# Altium schematic symbol library jlcpcb_2025_04_capacitors_extended_0805.schlib: 3281 symbols (part 15 of 18) (continued)
## GRM21BZ71H475KE15L
designator C?  Capacitance: 4.7uF  (hidden comment: *)
Capacitor, Ceramic (MLCC), 4.7uF, ±10%, 50V, X7R, ±10%, SMD 0805; Manufacturer: Murata Electronics; Manufacturer Part Number: GRM21BZ71H475KE15L; Package Size: 0805; JLCPCB Basic Part: No; JLCPCB Part Number: C437557; Supplier 1: LCSC; Category: Capacitors - MLCC; Supplier Part Number 1: C437557; Tolerance: ±10%; Voltage Rating: 50V; Temperature Coefficient: X7R; RoHS: Yes; ComponentLink1Description: Datasheet; ComponentLink1URL: https://wmsc.lcsc.com/wmsc/upload/file/pdf/v2/lcsc/2304140030_Murata-Electronics-GRM21BZ71H475KE15L_C437557.pdf; ComponentLink2Description: JLCPCB Part URL; ComponentLink2URL: https://jlcpcb.com/partdetail/C437557; ComponentLink3Description: LCSC Part URL; ComponentLink3URL: https://lcsc.com/product-detail/Multilayer-Ceramic-Capacitors-MLCC---SMD-SMT_Murata-Electronics-Murata-Electronics-GRM21BZ71H475KE15L_C437557.html
footprint CAP-0805 (0805 (2012M) Capacitor)
pins: 1, 2

## GRM216B11H223KA01D
designator C?  Capacitance: 22nF  (hidden comment: *)
Capacitor, Ceramic (MLCC), 22nF, ±10%, 50V, B, ±10%, SMD 0805; Manufacturer: Murata Electronics; Manufacturer Part Number: GRM216B11H223KA01D; Package Size: 0805; JLCPCB Basic Part: No; JLCPCB Part Number: C521244; Supplier 1: LCSC; Category: Capacitors - MLCC; Supplier Part Number 1: C521244; Tolerance: ±10%; Voltage Rating: 50V; Temperature Coefficient: B; RoHS: Yes; ComponentLink1Description: Datasheet; ComponentLink1URL: https://wmsc.lcsc.com/wmsc/upload/file/pdf/v2/lcsc/2005071505_Murata-Electronics-GRM216B11H223KA01D_C521244.pdf; ComponentLink2Description: JLCPCB Part URL; ComponentLink2URL: https://jlcpcb.com/partdetail/C521244; ComponentLink3Description: LCSC Part URL; ComponentLink3URL: https://lcsc.com/product-detail/Multilayer-Ceramic-Capacitors-MLCC---SMD-SMT_Murata-Electronics-Murata-Electronics-GRM216B11H223KA01D_C521244.html
footprint CAP-0805 (0805 (2012M) Capacitor)
pins: 1, 2

## GRM216R61E105KA12D
designator C?  Capacitance: 1uF  (hidden comment: *)
Capacitor, Ceramic (MLCC), 1uF, ±10%, 25V, X5R, ±10%, SMD 0805; Manufacturer: Murata Electronics; Manufacturer Part Number: GRM216R61E105KA12D; Package Size: 0805; JLCPCB Basic Part: No; JLCPCB Part Number: C440193; Supplier 1: LCSC; Category: Capacitors - MLCC; Supplier Part Number 1: C440193; Tolerance: ±10%; Voltage Rating: 25V; Temperature Coefficient: X5R; RoHS: Yes; ComponentLink1Description: Datasheet; ComponentLink1URL: https://wmsc.lcsc.com/wmsc/upload/file/pdf/v2/lcsc/2304140030_Murata-Electronics-GRM216R61E105KA12D_C440193.pdf; ComponentLink2Description: JLCPCB Part URL; ComponentLink2URL: https://jlcpcb.com/partdetail/C440193; ComponentLink3Description: LCSC Part URL; ComponentLink3URL: https://lcsc.com/product-detail/Multilayer-Ceramic-Capacitors-MLCC---SMD-SMT_Murata-Electronics-Murata-Electronics-GRM216R61E105KA12D_C440193.html
footprint CAP-0805 (0805 (2012M) Capacitor)
pins: 1, 2

## GRM216R71H103KA01D
designator C?  Capacitance: 10nF  (hidden comment: *)
Capacitor, Ceramic (MLCC), 10nF, ±10%, 50V, X7R, ±10%, SMD 0805; Manufacturer: Murata Electronics; Manufacturer Part Number: GRM216R71H103KA01D; Package Size: 0805; JLCPCB Basic Part: No; JLCPCB Part Number: C77065; Supplier 1: LCSC; Category: Capacitors - MLCC; Supplier Part Number 1: C77065; Tolerance: ±10%; Voltage Rating: 50V; Temperature Coefficient: X7R; RoHS: Yes; ComponentLink1Description: Datasheet; ComponentLink1URL: https://wmsc.lcsc.com/wmsc/upload/file/pdf/v2/lcsc/2304140030_Murata-Electronics-GRM216R71H103KA01D_C77065.pdf; ComponentLink2Description: JLCPCB Part URL; ComponentLink2URL: https://jlcpcb.com/partdetail/C77065; ComponentLink3Description: LCSC Part URL; ComponentLink3URL: https://lcsc.com/product-detail/Multilayer-Ceramic-Capacitors-MLCC---SMD-SMT_Murata-Electronics-Murata-Electronics-GRM216R71H103KA01D_C77065.html
footprint CAP-0805 (0805 (2012M) Capacitor)
pins: 1, 2

## GRM216R71H152KA01D
designator C?  Capacitance: 1.5nF  (hidden comment: *)
Capacitor, Ceramic (MLCC), 1.5nF, ±10%, 50V, X7R, ±10%, SMD 0805; Manufacturer: Murata Electronics; Manufacturer Part Number: GRM216R71H152KA01D; Package Size: 0805; JLCPCB Basic Part: No; JLCPCB Part Number: C408139; Supplier 1: LCSC; Category: Capacitors - MLCC; Supplier Part Number 1: C408139; Tolerance: ±10%; Voltage Rating: 50V; Temperature Coefficient: X7R; RoHS: Yes; ComponentLink1Description: Datasheet; ComponentLink1URL: https://wmsc.lcsc.com/wmsc/upload/file/pdf/v2/lcsc/2304140030_Murata-Electronics-GRM216R71H152KA01D_C408139.pdf; ComponentLink2Description: JLCPCB Part URL; ComponentLink2URL: https://jlcpcb.com/partdetail/C408139; ComponentLink3Description: LCSC Part URL; ComponentLink3URL: https://lcsc.com/product-detail/Multilayer-Ceramic-Capacitors-MLCC---SMD-SMT_Murata-Electronics-Murata-Electronics-GRM216R71H152KA01D_C408139.html
footprint CAP-0805 (0805 (2012M) Capacitor)
pins: 1, 2

## GRM216R71H153KA01D
designator C?  Capacitance: 15nF  (hidden comment: *)
Capacitor, Ceramic (MLCC), 15nF, ±10%, 50V, X7R, ±10%, SMD 0805; Manufacturer: Murata Electronics; Manufacturer Part Number: GRM216R71H153KA01D; Package Size: 0805; JLCPCB Basic Part: No; JLCPCB Part Number: C435404; Supplier 1: LCSC; Category: Capacitors - MLCC; Supplier Part Number 1: C435404; Tolerance: ±10%; Voltage Rating: 50V; Temperature Coefficient: X7R; RoHS: Yes; ComponentLink1Description: Datasheet; ComponentLink1URL: https://wmsc.lcsc.com/wmsc/upload/file/pdf/v2/lcsc/2304140030_Murata-Electronics-GRM216R71H153KA01D_C435404.pdf; ComponentLink2Description: JLCPCB Part URL; ComponentLink2URL: https://jlcpcb.com/partdetail/C435404; ComponentLink3Description: LCSC Part URL; ComponentLink3URL: https://lcsc.com/product-detail/Multilayer-Ceramic-Capacitors-MLCC---SMD-SMT_Murata-Electronics-Murata-Electronics-GRM216R71H153KA01D_C435404.html
footprint CAP-0805 (0805 (2012M) Capacitor)
pins: 1, 2

## GRM216R71H222KA01D
designator C?  Capacitance: 2.2nF  (hidden comment: *)
Capacitor, Ceramic (MLCC), 2.2nF, ±10%, 50V, X7R, ±10%, SMD 0805; Manufacturer: Murata Electronics; Manufacturer Part Number: GRM216R71H222KA01D; Package Size: 0805; JLCPCB Basic Part: No; JLCPCB Part Number: C425880; Supplier 1: LCSC; Category: Capacitors - MLCC; Supplier Part Number 1: C425880; Tolerance: ±10%; Voltage Rating: 50V; Temperature Coefficient: X7R; RoHS: Yes; ComponentLink1Description: Datasheet; ComponentLink1URL: https://wmsc.lcsc.com/wmsc/upload/file/pdf/v2/lcsc/2304140030_Murata-Electronics-GRM216R71H222KA01D_C425880.pdf; ComponentLink2Description: JLCPCB Part URL; ComponentLink2URL: https://jlcpcb.com/partdetail/C425880; ComponentLink3Description: LCSC Part URL; ComponentLink3URL: https://lcsc.com/product-detail/Multilayer-Ceramic-Capacitors-MLCC---SMD-SMT_Murata-Electronics-Murata-Electronics-GRM216R71H222KA01D_C425880.html
footprint CAP-0805 (0805 (2012M) Capacitor)
pins: 1, 2

## GRM219B11E224KA01D
designator C?  Capacitance: 220nF  (hidden comment: *)
Capacitor, Ceramic (MLCC), 220nF, ±10%, 25V, B, ±10%, SMD 0805; Manufacturer: Murata Electronics; Manufacturer Part Number: GRM219B11E224KA01D; Package Size: 0805; JLCPCB Basic Part: No; JLCPCB Part Number: C415405; Supplier 1: LCSC; Category: Capacitors - MLCC; Supplier Part Number 1: C415405; Tolerance: ±10%; Voltage Rating: 25V; Temperature Coefficient: B; RoHS: Yes; ComponentLink1Description: Datasheet; ComponentLink1URL: https://wmsc.lcsc.com/wmsc/upload/file/pdf/v2/lcsc/2304140030_Murata-Electronics-GRM219B11E224KA01D_C415405.pdf; ComponentLink2Description: JLCPCB Part URL; ComponentLink2URL: https://jlcpcb.com/partdetail/C415405; ComponentLink3Description: LCSC Part URL; ComponentLink3URL: https://lcsc.com/product-detail/Multilayer-Ceramic-Capacitors-MLCC---SMD-SMT_Murata-Electronics-Murata-Electronics-GRM219B11E224KA01D_C415405.html
footprint CAP-0805 (0805 (2012M) Capacitor)
pins: 1, 2

## GRM219B31A475KE33D
designator C?  Capacitance: 4.7uF  (hidden comment: *)
Capacitor, Ceramic (MLCC), 4.7uF, ±10%, ±10%, SMD 0805; Manufacturer: Murata Electronics; Manufacturer Part Number: GRM219B31A475KE33D; Package Size: 0805; JLCPCB Basic Part: No; JLCPCB Part Number: C913642; Supplier 1: LCSC; Category: Capacitors - MLCC; Supplier Part Number 1: C913642; Tolerance: ±10%; RoHS: Yes; ComponentLink1Description: Datasheet; ComponentLink1URL: https://wmsc.lcsc.com/wmsc/upload/file/pdf/v2/lcsc/2201131300_Murata-Electronics-GRM219B31A475KE33D_C913642.pdf; ComponentLink2Description: JLCPCB Part URL; ComponentLink2URL: https://jlcpcb.com/partdetail/C913642; ComponentLink3Description: LCSC Part URL; ComponentLink3URL: https://lcsc.com/product-detail/Multilayer-Ceramic-Capacitors-MLCC---SMD-SMT_Murata-Electronics-Murata-Electronics-GRM219B31A475KE33D_C913642.html
footprint CAP-0805 (0805 (2012M) Capacitor)
pins: 1, 2

## GRM219B31H225KE15D
designator C?  Capacitance: 2.2uF  (hidden comment: *)
Capacitor, Ceramic (MLCC), 2.2uF, ±10%, 50V, B, ±10%, SMD 0805; Manufacturer: Murata Electronics; Manufacturer Part Number: GRM219B31H225KE15D; Package Size: 0805; JLCPCB Basic Part: No; JLCPCB Part Number: C415371; Supplier 1: LCSC; Category: Capacitors - MLCC; Supplier Part Number 1: C415371; Tolerance: ±10%; Voltage Rating: 50V; Temperature Coefficient: B; RoHS: Yes; ComponentLink1Description: Datasheet; ComponentLink1URL: https://wmsc.lcsc.com/wmsc/upload/file/pdf/v2/lcsc/2304140030_Murata-Electronics-GRM219B31H225KE15D_C415371.pdf; ComponentLink2Description: JLCPCB Part URL; ComponentLink2URL: https://jlcpcb.com/partdetail/C415371; ComponentLink3Description: LCSC Part URL; ComponentLink3URL: https://lcsc.com/product-detail/Multilayer-Ceramic-Capacitors-MLCC---SMD-SMT_Murata-Electronics-Murata-Electronics-GRM219B31H225KE15D_C415371.html
footprint CAP-0805 (0805 (2012M) Capacitor)
pins: 1, 2

## GRM219B31H334KA87D
designator C?  Capacitance: 330nF  (hidden comment: *)
Capacitor, Ceramic (MLCC), 330nF, ±10%, 50V, B, ±10%, SMD 0805; Manufacturer: Murata Electronics; Manufacturer Part Number: GRM219B31H334KA87D; Package Size: 0805; JLCPCB Basic Part: No; JLCPCB Part Number: C464408; Supplier 1: LCSC; Category: Capacitors - MLCC; Supplier Part Number 1: C464408; Tolerance: ±10%; Voltage Rating: 50V; Temperature Coefficient: B; RoHS: Yes; ComponentLink1Description: Datasheet; ComponentLink1URL: https://wmsc.lcsc.com/wmsc/upload/file/pdf/v2/lcsc/2304140030_Murata-Electronics-GRM219B31H334KA87D_C464408.pdf; ComponentLink2Description: JLCPCB Part URL; ComponentLink2URL: https://jlcpcb.com/partdetail/C464408; ComponentLink3Description: LCSC Part URL; ComponentLink3URL: https://lcsc.com/product-detail/Multilayer-Ceramic-Capacitors-MLCC---SMD-SMT_Murata-Electronics-Murata-Electronics-GRM219B31H334KA87D_C464408.html
footprint CAP-0805 (0805 (2012M) Capacitor)
pins: 1, 2

## GRM219C71E475KE21L
designator C?  Capacitance: 4.7uF  (hidden comment: *)
Capacitor, Ceramic (MLCC), 4.7uF, ±10%, 25V, X7S, ±10%, SMD 0805; Manufacturer: Murata Electronics; Manufacturer Part Number: GRM219C71E475KE21L; Package Size: 0805; JLCPCB Basic Part: No; JLCPCB Part Number: C710952; Supplier 1: LCSC; Category: Capacitors - MLCC; Supplier Part Number 1: C710952; Tolerance: ±10%; Voltage Rating: 25V; Temperature Coefficient: X7S; RoHS: Yes; ComponentLink1Description: Datasheet; ComponentLink1URL: https://wmsc.lcsc.com/wmsc/upload/file/pdf/v2/lcsc/2203221230_Murata-Electronics-GRM219C71E475KE21L_C710952.pdf; ComponentLink2Description: JLCPCB Part URL; ComponentLink2URL: https://jlcpcb.com/partdetail/C710952; ComponentLink3Description: LCSC Part URL; ComponentLink3URL: https://lcsc.com/product-detail/Multilayer-Ceramic-Capacitors-MLCC---SMD-SMT_Murata-Electronics-Murata-Electronics-GRM219C71E475KE21L_C710952.html
footprint CAP-0805 (0805 (2012M) Capacitor)
pins: 1, 2

## GRM219C81A475KE34D
designator C?  Capacitance: 4.7uF  (hidden comment: *)
Capacitor, Ceramic (MLCC), 4.7uF, ±10%, 10V, X6S, ±10%, SMD 0805; Manufacturer: Murata Electronics; Manufacturer Part Number: GRM219C81A475KE34D; Package Size: 0805; JLCPCB Basic Part: No; JLCPCB Part Number: C492069; Supplier 1: LCSC; Category: Capacitors - MLCC; Supplier Part Number 1: C492069; Tolerance: ±10%; Voltage Rating: 10V; Temperature Coefficient: X6S; RoHS: Yes; ComponentLink1Description: Datasheet; ComponentLink1URL: https://wmsc.lcsc.com/wmsc/upload/file/pdf/v2/lcsc/2308111611_Murata-Electronics-GRM219C81A475KE34D_C492069.pdf; ComponentLink2Description: JLCPCB Part URL; ComponentLink2URL: https://jlcpcb.com/partdetail/C492069; ComponentLink3Description: LCSC Part URL; ComponentLink3URL: https://lcsc.com/product-detail/Multilayer-Ceramic-Capacitors-MLCC---SMD-SMT_Murata-Electronics-Murata-Electronics-GRM219C81A475KE34D_C492069.html
footprint CAP-0805 (0805 (2012M) Capacitor)
pins: 1, 2

## GRM219C81C475KA73D
designator C?  Capacitance: 4.7uF  (hidden comment: *)
Capacitor, Ceramic (MLCC), 4.7uF, ±10%, 16V, X6S, ±10%, SMD 0805; Manufacturer: Murata Electronics; Manufacturer Part Number: GRM219C81C475KA73D; Package Size: 0805; JLCPCB Basic Part: No; JLCPCB Part Number: C426651; Supplier 1: LCSC; Category: Capacitors - MLCC; Supplier Part Number 1: C426651; Tolerance: ±10%; Voltage Rating: 16V; Temperature Coefficient: X6S; RoHS: Yes; ComponentLink1Description: Datasheet; ComponentLink1URL: https://wmsc.lcsc.com/wmsc/upload/file/pdf/v2/lcsc/2304140030_Murata-Electronics-GRM219C81C475KA73D_C426651.pdf; ComponentLink2Description: JLCPCB Part URL; ComponentLink2URL: https://jlcpcb.com/partdetail/C426651; ComponentLink3Description: LCSC Part URL; ComponentLink3URL: https://lcsc.com/product-detail/Multilayer-Ceramic-Capacitors-MLCC---SMD-SMT_Murata-Electronics-Murata-Electronics-GRM219C81C475KA73D_C426651.html
footprint CAP-0805 (0805 (2012M) Capacitor)
pins: 1, 2

## GRM219C81C475MA73D
designator C?  Capacitance: 4.7uF  (hidden comment: *)
Capacitor, Ceramic (MLCC), 4.7uF, ±20%, 16V, X6S, ±20%, SMD 0805; Manufacturer: Murata Electronics; Manufacturer Part Number: GRM219C81C475MA73D; Package Size: 0805; JLCPCB Basic Part: No; JLCPCB Part Number: C497528; Supplier 1: LCSC; Category: Capacitors - MLCC; Supplier Part Number 1: C497528; Tolerance: ±20%; Voltage Rating: 16V; Temperature Coefficient: X6S; RoHS: Yes; ComponentLink1Description: Datasheet; ComponentLink1URL: https://wmsc.lcsc.com/wmsc/upload/file/pdf/v2/lcsc/2003172222_Murata-Electronics-GRM219C81C475MA73D_C497528.pdf; ComponentLink2Description: JLCPCB Part URL; ComponentLink2URL: https://jlcpcb.com/partdetail/C497528; ComponentLink3Description: LCSC Part URL; ComponentLink3URL: https://lcsc.com/product-detail/Multilayer-Ceramic-Capacitors-MLCC---SMD-SMT_Murata-Electronics-Murata-Electronics-GRM219C81C475MA73D_C497528.html
footprint CAP-0805 (0805 (2012M) Capacitor)
pins: 1, 2

## GRM219R6YA475KA73D
designator C?  Capacitance: 4.7uF  (hidden comment: *)
Capacitor, Ceramic (MLCC), 4.7uF, ±10%, 35V, X5R, ±10%, SMD 0805; Manufacturer: Murata Electronics; Manufacturer Part Number: GRM219R6YA475KA73D; Package Size: 0805; JLCPCB Basic Part: No; JLCPCB Part Number: C913498; Supplier 1: LCSC; Category: Capacitors - MLCC; Supplier Part Number 1: C913498; Tolerance: ±10%; Voltage Rating: 35V; Temperature Coefficient: X5R; RoHS: Yes; ComponentLink1Description: Datasheet; ComponentLink1URL: https://wmsc.lcsc.com/wmsc/upload/file/pdf/v2/lcsc/2201131300_Murata-Electronics-GRM219R6YA475KA73D_C913498.pdf; ComponentLink2Description: JLCPCB Part URL; ComponentLink2URL: https://jlcpcb.com/partdetail/C913498; ComponentLink3Description: LCSC Part URL; ComponentLink3URL: https://lcsc.com/product-detail/Multilayer-Ceramic-Capacitors-MLCC---SMD-SMT_Murata-Electronics-Murata-Electronics-GRM219R6YA475KA73D_C913498.html
footprint CAP-0805 (0805 (2012M) Capacitor)
pins: 1, 2

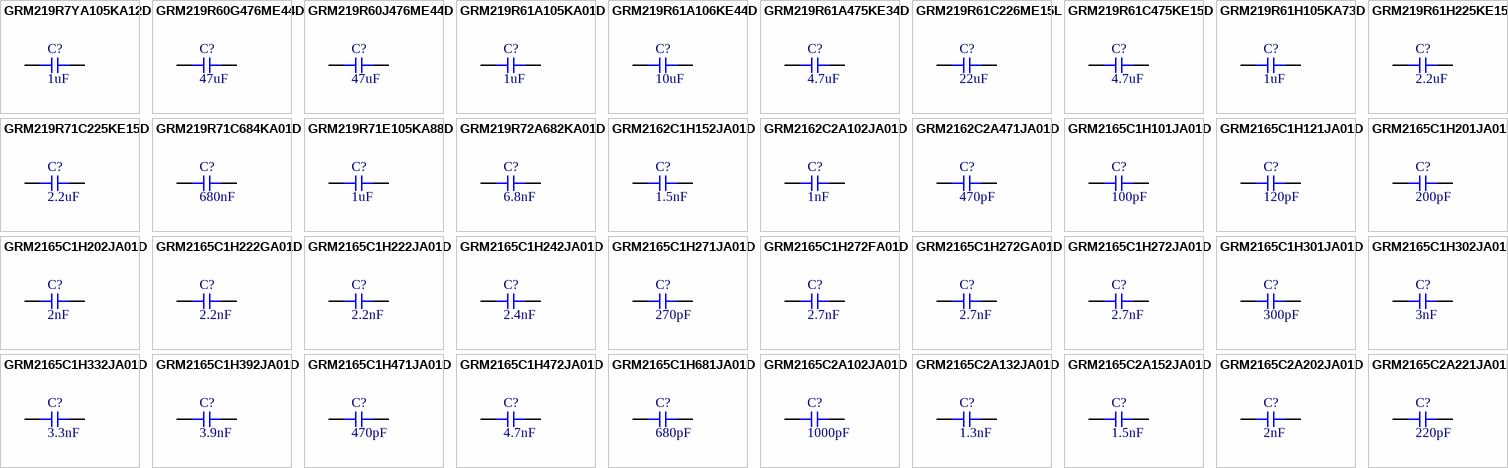
[diagram p68: symbols GRM219R7YA105KA12D to GRM2165C2A221JA01D]

## GRM219R7YA105KA12D
designator C?  Capacitance: 1uF  (hidden comment: *)
Capacitor, Ceramic (MLCC), 1uF, ±10%, 35V, X7R, ±10%, SMD 0805; Manufacturer: Murata Electronics; Manufacturer Part Number: GRM219R7YA105KA12D; Package Size: 0805; JLCPCB Basic Part: No; JLCPCB Part Number: C440196; Supplier 1: LCSC; Category: Capacitors - MLCC; Supplier Part Number 1: C440196; Tolerance: ±10%; Voltage Rating: 35V; Temperature Coefficient: X7R; RoHS: Yes; ComponentLink1Description: Datasheet; ComponentLink1URL: https://wmsc.lcsc.com/wmsc/upload/file/pdf/v2/lcsc/2304140030_Murata-Electronics-GRM219R7YA105KA12D_C440196.pdf; ComponentLink2Description: JLCPCB Part URL; ComponentLink2URL: https://jlcpcb.com/partdetail/C440196; ComponentLink3Description: LCSC Part URL; ComponentLink3URL: https://lcsc.com/product-detail/Multilayer-Ceramic-Capacitors-MLCC---SMD-SMT_Murata-Electronics-Murata-Electronics-GRM219R7YA105KA12D_C440196.html
footprint CAP-0805 (0805 (2012M) Capacitor)
pins: 1, 2

## GRM219R60G476ME44D
designator C?  Capacitance: 47uF  (hidden comment: *)
Capacitor, Ceramic (MLCC), 47uF, ±20%, 4V, X5R, ±20%, SMD 0805; Manufacturer: Murata Electronics; Manufacturer Part Number: GRM219R60G476ME44D; Package Size: 0805; JLCPCB Basic Part: No; JLCPCB Part Number: C913559; Supplier 1: LCSC; Category: Capacitors - MLCC; Supplier Part Number 1: C913559; Tolerance: ±20%; Voltage Rating: 4V; Temperature Coefficient: X5R; RoHS: Yes; ComponentLink1Description: Datasheet; ComponentLink1URL: https://wmsc.lcsc.com/wmsc/upload/file/pdf/v2/lcsc/2201131300_Murata-Electronics-GRM219R60G476ME44D_C913559.pdf; ComponentLink2Description: JLCPCB Part URL; ComponentLink2URL: https://jlcpcb.com/partdetail/C913559; ComponentLink3Description: LCSC Part URL; ComponentLink3URL: https://lcsc.com/product-detail/Multilayer-Ceramic-Capacitors-MLCC---SMD-SMT_Murata-Electronics-Murata-Electronics-GRM219R60G476ME44D_C913559.html
footprint CAP-0805 (0805 (2012M) Capacitor)
pins: 1, 2

## GRM219R60J476ME44D
designator C?  Capacitance: 47uF  (hidden comment: *)
Capacitor, Ceramic (MLCC), 47uF, ±20%, 6.3V, X5R, ±20%, SMD 0805; Manufacturer: Murata Electronics; Manufacturer Part Number: GRM219R60J476ME44D; Package Size: 0805; JLCPCB Basic Part: No; JLCPCB Part Number: C471380; Supplier 1: LCSC; Category: Capacitors - MLCC; Supplier Part Number 1: C471380; Tolerance: ±20%; Voltage Rating: 6.3V; Temperature Coefficient: X5R; RoHS: Yes; ComponentLink1Description: Datasheet; ComponentLink1URL: https://wmsc.lcsc.com/wmsc/upload/file/pdf/v2/lcsc/2001071133_Murata-Electronics-GRM219R60J476ME44D_C471380.pdf; ComponentLink2Description: JLCPCB Part URL; ComponentLink2URL: https://jlcpcb.com/partdetail/C471380; ComponentLink3Description: LCSC Part URL; ComponentLink3URL: https://lcsc.com/product-detail/Multilayer-Ceramic-Capacitors-MLCC---SMD-SMT_Murata-Electronics-Murata-Electronics-GRM219R60J476ME44D_C471380.html
footprint CAP-0805 (0805 (2012M) Capacitor)
pins: 1, 2

## GRM219R61A105KA01D
designator C?  Capacitance: 1uF  (hidden comment: *)
Capacitor, Ceramic (MLCC), 1uF, ±10%, 10V, X5R, ±10%, SMD 0805; Manufacturer: Murata Electronics; Manufacturer Part Number: GRM219R61A105KA01D; Package Size: 0805; JLCPCB Basic Part: No; JLCPCB Part Number: C440195; Supplier 1: LCSC; Category: Capacitors - MLCC; Supplier Part Number 1: C440195; Tolerance: ±10%; Voltage Rating: 10V; Temperature Coefficient: X5R; RoHS: Yes; ComponentLink1Description: Datasheet; ComponentLink1URL: https://wmsc.lcsc.com/wmsc/upload/file/pdf/v2/lcsc/2304140030_Murata-Electronics-GRM219R61A105KA01D_C440195.pdf; ComponentLink2Description: JLCPCB Part URL; ComponentLink2URL: https://jlcpcb.com/partdetail/C440195; ComponentLink3Description: LCSC Part URL; ComponentLink3URL: https://lcsc.com/product-detail/Multilayer-Ceramic-Capacitors-MLCC---SMD-SMT_Murata-Electronics-Murata-Electronics-GRM219R61A105KA01D_C440195.html
footprint CAP-0805 (0805 (2012M) Capacitor)
pins: 1, 2

## GRM219R61A106KE44D
designator C?  Capacitance: 10uF  (hidden comment: *)
Capacitor, Ceramic (MLCC), 10uF, ±10%, 10V, X5R, ±10%, SMD 0805; Manufacturer: Murata Electronics; Manufacturer Part Number: GRM219R61A106KE44D; Package Size: 0805; JLCPCB Basic Part: No; JLCPCB Part Number: C469539; Supplier 1: LCSC; Category: Capacitors - MLCC; Supplier Part Number 1: C469539; Tolerance: ±10%; Voltage Rating: 10V; Temperature Coefficient: X5R; RoHS: Yes; ComponentLink1Description: Datasheet; ComponentLink1URL: https://wmsc.lcsc.com/wmsc/upload/file/pdf/v2/lcsc/1912241611_Murata-Electronics-GRM219R61A106KE44D_C469539.pdf; ComponentLink2Description: JLCPCB Part URL; ComponentLink2URL: https://jlcpcb.com/partdetail/C469539; ComponentLink3Description: LCSC Part URL; ComponentLink3URL: https://lcsc.com/product-detail/Multilayer-Ceramic-Capacitors-MLCC---SMD-SMT_Murata-Electronics-Murata-Electronics-GRM219R61A106KE44D_C469539.html
footprint CAP-0805 (0805 (2012M) Capacitor)
pins: 1, 2

## GRM219R61A475KE34D
designator C?  Capacitance: 4.7uF  (hidden comment: *)
Capacitor, Ceramic (MLCC), 4.7uF, ±10%, 10V, X5R, ±10%, SMD 0805; Manufacturer: Murata Electronics; Manufacturer Part Number: GRM219R61A475KE34D; Package Size: 0805; JLCPCB Basic Part: No; JLCPCB Part Number: C237307; Supplier 1: LCSC; Category: Capacitors - MLCC; Supplier Part Number 1: C237307; Tolerance: ±10%; Voltage Rating: 10V; Temperature Coefficient: X5R; RoHS: Yes; ComponentLink1Description: Datasheet; ComponentLink1URL: https://wmsc.lcsc.com/wmsc/upload/file/pdf/v2/lcsc/2001071808_Murata-Electronics-GRM219R61A475KE34D_C237307.pdf; ComponentLink2Description: JLCPCB Part URL; ComponentLink2URL: https://jlcpcb.com/partdetail/C237307; ComponentLink3Description: LCSC Part URL; ComponentLink3URL: https://lcsc.com/product-detail/Multilayer-Ceramic-Capacitors-MLCC---SMD-SMT_Murata-Electronics-Murata-Electronics-GRM219R61A475KE34D_C237307.html
footprint CAP-0805 (0805 (2012M) Capacitor)
pins: 1, 2

## GRM219R61C226ME15L
designator C?  Capacitance: 22uF  (hidden comment: *)
Capacitor, Ceramic (MLCC), 22uF, ±20%, 16V, X5R, ±20%, SMD 0805; Manufacturer: Murata Electronics; Manufacturer Part Number: GRM219R61C226ME15L; Package Size: 0805; JLCPCB Basic Part: No; JLCPCB Part Number: C162295; Supplier 1: LCSC; Category: Capacitors - MLCC; Supplier Part Number 1: C162295; Tolerance: ±20%; Voltage Rating: 16V; Temperature Coefficient: X5R; RoHS: Yes; ComponentLink1Description: Datasheet; ComponentLink1URL: https://wmsc.lcsc.com/wmsc/upload/file/pdf/v2/lcsc/1811141821_Murata-Electronics-GRM219R61C226ME15L_C162295.pdf; ComponentLink2Description: JLCPCB Part URL; ComponentLink2URL: https://jlcpcb.com/partdetail/C162295; ComponentLink3Description: LCSC Part URL; ComponentLink3URL: https://lcsc.com/product-detail/Multilayer-Ceramic-Capacitors-MLCC---SMD-SMT_Murata-Electronics-Murata-Electronics-GRM219R61C226ME15L_C162295.html
footprint CAP-0805 (0805 (2012M) Capacitor)
pins: 1, 2

## GRM219R61C475KE15D
designator C?  Capacitance: 4.7uF  (hidden comment: *)
Capacitor, Ceramic (MLCC), 4.7uF, ±10%, 16V, X5R, ±10%, SMD 0805; Manufacturer: Murata Electronics; Manufacturer Part Number: GRM219R61C475KE15D; Package Size: 0805; JLCPCB Basic Part: No; JLCPCB Part Number: C162296; Supplier 1: LCSC; Category: Capacitors - MLCC; Supplier Part Number 1: C162296; Tolerance: ±10%; Voltage Rating: 16V; Temperature Coefficient: X5R; RoHS: Yes; ComponentLink1Description: Datasheet; ComponentLink1URL: https://wmsc.lcsc.com/wmsc/upload/file/pdf/v2/lcsc/2304140030_Murata-Electronics-GRM219R61C475KE15D_C162296.pdf; ComponentLink2Description: JLCPCB Part URL; ComponentLink2URL: https://jlcpcb.com/partdetail/C162296; ComponentLink3Description: LCSC Part URL; ComponentLink3URL: https://lcsc.com/product-detail/Multilayer-Ceramic-Capacitors-MLCC---SMD-SMT_Murata-Electronics-Murata-Electronics-GRM219R61C475KE15D_C162296.html
footprint CAP-0805 (0805 (2012M) Capacitor)
pins: 1, 2

## GRM219R61H105KA73D
designator C?  Capacitance: 1uF  (hidden comment: *)
Capacitor, Ceramic (MLCC), 1uF, ±10%, 50V, X5R, ±10%, SMD 0805; Manufacturer: Murata Electronics; Manufacturer Part Number: GRM219R61H105KA73D; Package Size: 0805; JLCPCB Basic Part: No; JLCPCB Part Number: C426085; Supplier 1: LCSC; Category: Capacitors - MLCC; Supplier Part Number 1: C426085; Tolerance: ±10%; Voltage Rating: 50V; Temperature Coefficient: X5R; RoHS: Yes; ComponentLink1Description: Datasheet; ComponentLink1URL: https://wmsc.lcsc.com/wmsc/upload/file/pdf/v2/lcsc/2304140030_Murata-Electronics-GRM219R61H105KA73D_C426085.pdf; ComponentLink2Description: JLCPCB Part URL; ComponentLink2URL: https://jlcpcb.com/partdetail/C426085; ComponentLink3Description: LCSC Part URL; ComponentLink3URL: https://lcsc.com/product-detail/Multilayer-Ceramic-Capacitors-MLCC---SMD-SMT_Murata-Electronics-Murata-Electronics-GRM219R61H105KA73D_C426085.html
footprint CAP-0805 (0805 (2012M) Capacitor)
pins: 1, 2

## GRM219R61H225KE15D
designator C?  Capacitance: 2.2uF  (hidden comment: *)
Capacitor, Ceramic (MLCC), 2.2uF, ±10%, 50V, X5R, ±10%, SMD 0805; Manufacturer: Murata Electronics; Manufacturer Part Number: GRM219R61H225KE15D; Package Size: 0805; JLCPCB Basic Part: No; JLCPCB Part Number: C162299; Supplier 1: LCSC; Category: Capacitors - MLCC; Supplier Part Number 1: C162299; Tolerance: ±10%; Voltage Rating: 50V; Temperature Coefficient: X5R; RoHS: Yes; ComponentLink1Description: Datasheet; ComponentLink1URL: https://wmsc.lcsc.com/wmsc/upload/file/pdf/v2/lcsc/1912111437_Murata-Electronics-GRM219R61H225KE15D_C162299.pdf; ComponentLink2Description: JLCPCB Part URL; ComponentLink2URL: https://jlcpcb.com/partdetail/C162299; ComponentLink3Description: LCSC Part URL; ComponentLink3URL: https://lcsc.com/product-detail/Multilayer-Ceramic-Capacitors-MLCC---SMD-SMT_Murata-Electronics-Murata-Electronics-GRM219R61H225KE15D_C162299.html
footprint CAP-0805 (0805 (2012M) Capacitor)
pins: 1, 2

## GRM219R71C225KE15D
designator C?  Capacitance: 2.2uF  (hidden comment: *)
Capacitor, Ceramic (MLCC), 2.2uF, ±10%, 16V, X7R, ±10%, SMD 0805; Manufacturer: Murata Electronics; Manufacturer Part Number: GRM219R71C225KE15D; Package Size: 0805; JLCPCB Basic Part: No; JLCPCB Part Number: C86034; Supplier 1: LCSC; Category: Capacitors - MLCC; Supplier Part Number 1: C86034; Tolerance: ±10%; Voltage Rating: 16V; Temperature Coefficient: X7R; RoHS: Yes; ComponentLink1Description: Datasheet; ComponentLink1URL: https://wmsc.lcsc.com/wmsc/upload/file/pdf/v2/lcsc/2304140030_Murata-Electronics-GRM219R71C225KE15D_C86034.pdf; ComponentLink2Description: JLCPCB Part URL; ComponentLink2URL: https://jlcpcb.com/partdetail/C86034; ComponentLink3Description: LCSC Part URL; ComponentLink3URL: https://lcsc.com/product-detail/Multilayer-Ceramic-Capacitors-MLCC---SMD-SMT_Murata-Electronics-Murata-Electronics-GRM219R71C225KE15D_C86034.html
footprint CAP-0805 (0805 (2012M) Capacitor)
pins: 1, 2

## GRM219R71C684KA01D
designator C?  Capacitance: 680nF  (hidden comment: *)
Capacitor, Ceramic (MLCC), 680nF, ±10%, 16V, X7R, ±10%, SMD 0805; Manufacturer: Murata Electronics; Manufacturer Part Number: GRM219R71C684KA01D; Package Size: 0805; JLCPCB Basic Part: No; JLCPCB Part Number: C415412; Supplier 1: LCSC; Category: Capacitors - MLCC; Supplier Part Number 1: C415412; Tolerance: ±10%; Voltage Rating: 16V; Temperature Coefficient: X7R; RoHS: Yes; ComponentLink1Description: Datasheet; ComponentLink1URL: https://wmsc.lcsc.com/wmsc/upload/file/pdf/v2/lcsc/2304140030_Murata-Electronics-GRM219R71C684KA01D_C415412.pdf; ComponentLink2Description: JLCPCB Part URL; ComponentLink2URL: https://jlcpcb.com/partdetail/C415412; ComponentLink3Description: LCSC Part URL; ComponentLink3URL: https://lcsc.com/product-detail/Multilayer-Ceramic-Capacitors-MLCC---SMD-SMT_Murata-Electronics-Murata-Electronics-GRM219R71C684KA01D_C415412.html
footprint CAP-0805 (0805 (2012M) Capacitor)
pins: 1, 2

## GRM219R71E105KA88D
designator C?  Capacitance: 1uF  (hidden comment: *)
Capacitor, Ceramic (MLCC), 1uF, ±10%, 25V, X7R, ±10%, SMD 0805; Manufacturer: Murata Electronics; Manufacturer Part Number: GRM219R71E105KA88D; Package Size: 0805; JLCPCB Basic Part: No; JLCPCB Part Number: C86035; Supplier 1: LCSC; Category: Capacitors - MLCC; Supplier Part Number 1: C86035; Tolerance: ±10%; Voltage Rating: 25V; Temperature Coefficient: X7R; RoHS: Yes; ComponentLink1Description: Datasheet; ComponentLink1URL: https://wmsc.lcsc.com/wmsc/upload/file/pdf/v2/lcsc/2304140030_Murata-Electronics-GRM219R71E105KA88D_C86035.pdf; ComponentLink2Description: JLCPCB Part URL; ComponentLink2URL: https://jlcpcb.com/partdetail/C86035; ComponentLink3Description: LCSC Part URL; ComponentLink3URL: https://lcsc.com/product-detail/Multilayer-Ceramic-Capacitors-MLCC---SMD-SMT_Murata-Electronics-Murata-Electronics-GRM219R71E105KA88D_C86035.html
footprint CAP-0805 (0805 (2012M) Capacitor)
pins: 1, 2

## GRM219R72A682KA01D
designator C?  Capacitance: 6.8nF  (hidden comment: *)
Capacitor, Ceramic (MLCC), 6.8nF, ±10%, 100V, X7R, ±10%, SMD 0805; Manufacturer: Murata Electronics; Manufacturer Part Number: GRM219R72A682KA01D; Package Size: 0805; JLCPCB Basic Part: No; JLCPCB Part Number: C2987937; Supplier 1: LCSC; Category: Capacitors - MLCC; Supplier Part Number 1: C2987937; Tolerance: ±10%; Voltage Rating: 100V; Temperature Coefficient: X7R; RoHS: Yes; ComponentLink1Description: Datasheet; ComponentLink1URL: https://wmsc.lcsc.com/wmsc/upload/file/pdf/v2/lcsc/2206211730_Murata-Electronics-GRM219R72A682KA01D_C2987937.pdf; ComponentLink2Description: JLCPCB Part URL; ComponentLink2URL: https://jlcpcb.com/partdetail/C2987937; ComponentLink3Description: LCSC Part URL; ComponentLink3URL: https://lcsc.com/product-detail/Multilayer-Ceramic-Capacitors-MLCC---SMD-SMT_Murata-Electronics-Murata-Electronics-GRM219R72A682KA01D_C2987937.html
footprint CAP-0805 (0805 (2012M) Capacitor)
pins: 1, 2

## GRM2162C1H152JA01D
designator C?  Capacitance: 1.5nF  (hidden comment: *)
Capacitor, Ceramic (MLCC), 1.5nF, ±5%, ±5%, SMD 0805; Manufacturer: Murata Electronics; Manufacturer Part Number: GRM2162C1H152JA01D; Package Size: 0805; JLCPCB Basic Part: No; JLCPCB Part Number: C913646; Supplier 1: LCSC; Category: Capacitors - MLCC; Supplier Part Number 1: C913646; Tolerance: ±5%; RoHS: Yes; ComponentLink1Description: Datasheet; ComponentLink1URL: https://wmsc.lcsc.com/wmsc/upload/file/pdf/v2/lcsc/2201131300_Murata-Electronics-GRM2162C1H152JA01D_C913646.pdf; ComponentLink2Description: JLCPCB Part URL; ComponentLink2URL: https://jlcpcb.com/partdetail/C913646; ComponentLink3Description: LCSC Part URL; ComponentLink3URL: https://lcsc.com/product-detail/Multilayer-Ceramic-Capacitors-MLCC---SMD-SMT_Murata-Electronics-Murata-Electronics-GRM2162C1H152JA01D_C913646.html
footprint CAP-0805 (0805 (2012M) Capacitor)
pins: 1, 2

## GRM2162C2A102JA01D
designator C?  Capacitance: 1nF  (hidden comment: *)
Capacitor, Ceramic (MLCC), 1nF, ±5%, 100V, CH, ±5%, SMD 0805; Manufacturer: Murata Electronics; Manufacturer Part Number: GRM2162C2A102JA01D; Package Size: 0805; JLCPCB Basic Part: No; JLCPCB Part Number: C162285; Supplier 1: LCSC; Category: Capacitors - MLCC; Supplier Part Number 1: C162285; Tolerance: ±5%; Voltage Rating: 100V; Temperature Coefficient: CH; RoHS: Yes; ComponentLink1Description: Datasheet; ComponentLink1URL: https://wmsc.lcsc.com/wmsc/upload/file/pdf/v2/lcsc/2304140030_Murata-Electronics-GRM2162C2A102JA01D_C162285.pdf; ComponentLink2Description: JLCPCB Part URL; ComponentLink2URL: https://jlcpcb.com/partdetail/C162285; ComponentLink3Description: LCSC Part URL; ComponentLink3URL: https://lcsc.com/product-detail/Multilayer-Ceramic-Capacitors-MLCC---SMD-SMT_Murata-Electronics-Murata-Electronics-GRM2162C2A102JA01D_C162285.html
footprint CAP-0805 (0805 (2012M) Capacitor)
pins: 1, 2

## GRM2162C2A471JA01D
designator C?  Capacitance: 470pF  (hidden comment: *)
Capacitor, Ceramic (MLCC), 470pF, ±5%, ±5%, SMD 0805; Manufacturer: Murata Electronics; Manufacturer Part Number: GRM2162C2A471JA01D; Package Size: 0805; JLCPCB Basic Part: No; JLCPCB Part Number: C913717; Supplier 1: LCSC; Category: Capacitors - MLCC; Supplier Part Number 1: C913717; Tolerance: ±5%; RoHS: Yes; ComponentLink1Description: Datasheet; ComponentLink1URL: https://wmsc.lcsc.com/wmsc/upload/file/pdf/v2/lcsc/2201131300_Murata-Electronics-GRM2162C2A471JA01D_C913717.pdf; ComponentLink2Description: JLCPCB Part URL; ComponentLink2URL: https://jlcpcb.com/partdetail/C913717; ComponentLink3Description: LCSC Part URL; ComponentLink3URL: https://lcsc.com/product-detail/Multilayer-Ceramic-Capacitors-MLCC---SMD-SMT_Murata-Electronics-Murata-Electronics-GRM2162C2A471JA01D_C913717.html
footprint CAP-0805 (0805 (2012M) Capacitor)
pins: 1, 2

## GRM2165C1H101JA01D
designator C?  Capacitance: 100pF  (hidden comment: *)
Capacitor, Ceramic (MLCC), 100pF, ±5%, 50V, C0G, ±5%, SMD 0805; Manufacturer: Murata Electronics; Manufacturer Part Number: GRM2165C1H101JA01D; Package Size: 0805; JLCPCB Basic Part: No; JLCPCB Part Number: C77059; Supplier 1: LCSC; Category: Capacitors - MLCC; Supplier Part Number 1: C77059; Tolerance: ±5%; Voltage Rating: 50V; Temperature Coefficient: C0G; RoHS: Yes; ComponentLink1Description: Datasheet; ComponentLink1URL: https://wmsc.lcsc.com/wmsc/upload/file/pdf/v2/lcsc/2304140030_Murata-Electronics-GRM2165C1H101JA01D_C77059.pdf; ComponentLink2Description: JLCPCB Part URL; ComponentLink2URL: https://jlcpcb.com/partdetail/C77059; ComponentLink3Description: LCSC Part URL; ComponentLink3URL: https://lcsc.com/product-detail/Multilayer-Ceramic-Capacitors-MLCC---SMD-SMT_Murata-Electronics-Murata-Electronics-GRM2165C1H101JA01D_C77059.html
footprint CAP-0805 (0805 (2012M) Capacitor)
pins: 1, 2

## GRM2165C1H121JA01D
designator C?  Capacitance: 120pF  (hidden comment: *)
Capacitor, Ceramic (MLCC), 120pF, ±5%, 50V, C0G, ±5%, SMD 0805; Manufacturer: Murata Electronics; Manufacturer Part Number: GRM2165C1H121JA01D; Package Size: 0805; JLCPCB Basic Part: No; JLCPCB Part Number: C437541; Supplier 1: LCSC; Category: Capacitors - MLCC; Supplier Part Number 1: C437541; Tolerance: ±5%; Voltage Rating: 50V; Temperature Coefficient: C0G; RoHS: Yes; ComponentLink1Description: Datasheet; ComponentLink1URL: https://wmsc.lcsc.com/wmsc/upload/file/pdf/v2/lcsc/2304140030_Murata-Electronics-GRM2165C1H121JA01D_C437541.pdf; ComponentLink2Description: JLCPCB Part URL; ComponentLink2URL: https://jlcpcb.com/partdetail/C437541; ComponentLink3Description: LCSC Part URL; ComponentLink3URL: https://lcsc.com/product-detail/Multilayer-Ceramic-Capacitors-MLCC---SMD-SMT_Murata-Electronics-Murata-Electronics-GRM2165C1H121JA01D_C437541.html
footprint CAP-0805 (0805 (2012M) Capacitor)
pins: 1, 2

## GRM2165C1H201JA01D
designator C?  Capacitance: 200pF  (hidden comment: *)
Capacitor, Ceramic (MLCC), 200pF, ±5%, 50V, C0G, ±5%, SMD 0805; Manufacturer: Murata Electronics; Manufacturer Part Number: GRM2165C1H201JA01D; Package Size: 0805; JLCPCB Basic Part: No; JLCPCB Part Number: C470854; Supplier 1: LCSC; Category: Capacitors - MLCC; Supplier Part Number 1: C470854; Tolerance: ±5%; Voltage Rating: 50V; Temperature Coefficient: C0G; RoHS: Yes; ComponentLink1Description: Datasheet; ComponentLink1URL: https://wmsc.lcsc.com/wmsc/upload/file/pdf/v2/lcsc/2005150702_Murata-Electronics-GRM2165C1H201JA01D_C470854.pdf; ComponentLink2Description: JLCPCB Part URL; ComponentLink2URL: https://jlcpcb.com/partdetail/C470854; ComponentLink3Description: LCSC Part URL; ComponentLink3URL: https://lcsc.com/product-detail/Multilayer-Ceramic-Capacitors-MLCC---SMD-SMT_Murata-Electronics-Murata-Electronics-GRM2165C1H201JA01D_C470854.html
footprint CAP-0805 (0805 (2012M) Capacitor)
pins: 1, 2

## GRM2165C1H202JA01D
designator C?  Capacitance: 2nF  (hidden comment: *)
Capacitor, Ceramic (MLCC), 2nF, ±5%, 50V, C0G, ±5%, SMD 0805; Manufacturer: Murata Electronics; Manufacturer Part Number: GRM2165C1H202JA01D; Package Size: 0805; JLCPCB Basic Part: No; JLCPCB Part Number: C162288; Supplier 1: LCSC; Category: Capacitors - MLCC; Supplier Part Number 1: C162288; Tolerance: ±5%; Voltage Rating: 50V; Temperature Coefficient: C0G; RoHS: Yes; ComponentLink1Description: Datasheet; ComponentLink1URL: https://wmsc.lcsc.com/wmsc/upload/file/pdf/v2/lcsc/1810201330_Murata-Electronics-GRM2165C1H202JA01D_C162288.pdf; ComponentLink2Description: JLCPCB Part URL; ComponentLink2URL: https://jlcpcb.com/partdetail/C162288; ComponentLink3Description: LCSC Part URL; ComponentLink3URL: https://lcsc.com/product-detail/Multilayer-Ceramic-Capacitors-MLCC---SMD-SMT_Murata-Electronics-Murata-Electronics-GRM2165C1H202JA01D_C162288.html
footprint CAP-0805 (0805 (2012M) Capacitor)
pins: 1, 2

## GRM2165C1H222GA01D
designator C?  Capacitance: 2.2nF  (hidden comment: *)
Capacitor, Ceramic (MLCC), 2.2nF, ±2%, 50V, C0G, ±2%, SMD 0805; Manufacturer: Murata Electronics; Manufacturer Part Number: GRM2165C1H222GA01D; Package Size: 0805; JLCPCB Basic Part: No; JLCPCB Part Number: C527964; Supplier 1: LCSC; Category: Capacitors - MLCC; Supplier Part Number 1: C527964; Tolerance: ±2%; Voltage Rating: 50V; Temperature Coefficient: C0G; RoHS: Yes; ComponentLink1Description: Datasheet; ComponentLink1URL: https://wmsc.lcsc.com/wmsc/upload/file/pdf/v2/lcsc/2304140030_Murata-Electronics-GRM2165C1H222GA01D_C527964.pdf; ComponentLink2Description: JLCPCB Part URL; ComponentLink2URL: https://jlcpcb.com/partdetail/C527964; ComponentLink3Description: LCSC Part URL; ComponentLink3URL: https://lcsc.com/product-detail/Multilayer-Ceramic-Capacitors-MLCC---SMD-SMT_Murata-Electronics-Murata-Electronics-GRM2165C1H222GA01D_C527964.html
footprint CAP-0805 (0805 (2012M) Capacitor)
pins: 1, 2

## GRM2165C1H222JA01D
designator C?  Capacitance: 2.2nF  (hidden comment: *)
Capacitor, Ceramic (MLCC), 2.2nF, ±5%, 50V, C0G, ±5%, SMD 0805; Manufacturer: Murata Electronics; Manufacturer Part Number: GRM2165C1H222JA01D; Package Size: 0805; JLCPCB Basic Part: No; JLCPCB Part Number: C77060; Supplier 1: LCSC; Category: Capacitors - MLCC; Supplier Part Number 1: C77060; Tolerance: ±5%; Voltage Rating: 50V; Temperature Coefficient: C0G; RoHS: Yes; ComponentLink1Description: Datasheet; ComponentLink1URL: https://wmsc.lcsc.com/wmsc/upload/file/pdf/v2/lcsc/2304140030_Murata-Electronics-GRM2165C1H222JA01D_C77060.pdf; ComponentLink2Description: JLCPCB Part URL; ComponentLink2URL: https://jlcpcb.com/partdetail/C77060; ComponentLink3Description: LCSC Part URL; ComponentLink3URL: https://lcsc.com/product-detail/Multilayer-Ceramic-Capacitors-MLCC---SMD-SMT_Murata-Electronics-Murata-Electronics-GRM2165C1H222JA01D_C77060.html
footprint CAP-0805 (0805 (2012M) Capacitor)
pins: 1, 2

## GRM2165C1H242JA01D
designator C?  Capacitance: 2.4nF  (hidden comment: *)
Capacitor, Ceramic (MLCC), 2.4nF, ±5%, 50V, C0G, ±5%, SMD 0805; Manufacturer: Murata Electronics; Manufacturer Part Number: GRM2165C1H242JA01D; Package Size: 0805; JLCPCB Basic Part: No; JLCPCB Part Number: C710933; Supplier 1: LCSC; Category: Capacitors - MLCC; Supplier Part Number 1: C710933; Tolerance: ±5%; Voltage Rating: 50V; Temperature Coefficient: C0G; RoHS: Yes; ComponentLink1Description: Datasheet; ComponentLink1URL: https://wmsc.lcsc.com/wmsc/upload/file/pdf/v2/lcsc/2308111640_Murata-Electronics-GRM2165C1H242JA01D_C710933.pdf; ComponentLink2Description: JLCPCB Part URL; ComponentLink2URL: https://jlcpcb.com/partdetail/C710933; ComponentLink3Description: LCSC Part URL; ComponentLink3URL: https://lcsc.com/product-detail/Multilayer-Ceramic-Capacitors-MLCC---SMD-SMT_Murata-Electronics-Murata-Electronics-GRM2165C1H242JA01D_C710933.html
footprint CAP-0805 (0805 (2012M) Capacitor)
pins: 1, 2

## GRM2165C1H271JA01D
designator C?  Capacitance: 270pF  (hidden comment: *)
Capacitor, Ceramic (MLCC), 270pF, ±5%, null, null, ±5%, SMD 0805; Manufacturer: Murata Electronics; Manufacturer Part Number: GRM2165C1H271JA01D; Package Size: 0805; JLCPCB Basic Part: No; JLCPCB Part Number: C440192; Supplier 1: LCSC; Category: Capacitors - MLCC; Supplier Part Number 1: C440192; Tolerance: ±5%; Voltage Rating: null; Temperature Coefficient: null; RoHS: Yes; ComponentLink1Description: Datasheet; ComponentLink1URL: https://wmsc.lcsc.com/wmsc/upload/file/pdf/v2/lcsc/2304140030_Murata-Electronics-GRM2165C1H271JA01D_C440192.pdf; ComponentLink2Description: JLCPCB Part URL; ComponentLink2URL: https://jlcpcb.com/partdetail/C440192; ComponentLink3Description: LCSC Part URL; ComponentLink3URL: https://lcsc.com/product-detail/Multilayer-Ceramic-Capacitors-MLCC---SMD-SMT_Murata-Electronics-Murata-Electronics-GRM2165C1H271JA01D_C440192.html
footprint CAP-0805 (0805 (2012M) Capacitor)
pins: 1, 2

## GRM2165C1H272FA01D
designator C?  Capacitance: 2.7nF  (hidden comment: *)
Capacitor, Ceramic (MLCC), 2.7nF, 50V, C0G, SMD 0805; Manufacturer: Murata Electronics; Manufacturer Part Number: GRM2165C1H272FA01D; Package Size: 0805; JLCPCB Basic Part: No; JLCPCB Part Number: C2987938; Supplier 1: LCSC; Category: Capacitors - MLCC; Supplier Part Number 1: C2987938; Voltage Rating: 50V; Temperature Coefficient: C0G; RoHS: Yes; ComponentLink1Description: Datasheet; ComponentLink1URL: https://wmsc.lcsc.com/wmsc/upload/file/pdf/v2/lcsc/2206281815_Murata-Electronics-GRM2165C1H272FA01D_C2987938.pdf; ComponentLink2Description: JLCPCB Part URL; ComponentLink2URL: https://jlcpcb.com/partdetail/C2987938; ComponentLink3Description: LCSC Part URL; ComponentLink3URL: https://lcsc.com/product-detail/Multilayer-Ceramic-Capacitors-MLCC---SMD-SMT_Murata-Electronics-Murata-Electronics-GRM2165C1H272FA01D_C2987938.html
footprint CAP-0805 (0805 (2012M) Capacitor)
pins: 1, 2

## GRM2165C1H272GA01D
designator C?  Capacitance: 2.7nF  (hidden comment: *)
Capacitor, Ceramic (MLCC), 2.7nF, ±2%, 50V, C0G, ±2%, SMD 0805; Manufacturer: Murata Electronics; Manufacturer Part Number: GRM2165C1H272GA01D; Package Size: 0805; JLCPCB Basic Part: No; JLCPCB Part Number: C692639; Supplier 1: LCSC; Category: Capacitors - MLCC; Supplier Part Number 1: C692639; Tolerance: ±2%; Voltage Rating: 50V; Temperature Coefficient: C0G; RoHS: Yes; ComponentLink1Description: Datasheet; ComponentLink1URL: https://wmsc.lcsc.com/wmsc/upload/file/pdf/v2/lcsc/2101062034_Murata-Electronics-GRM2165C1H272GA01D_C692639.pdf; ComponentLink2Description: JLCPCB Part URL; ComponentLink2URL: https://jlcpcb.com/partdetail/C692639; ComponentLink3Description: LCSC Part URL; ComponentLink3URL: https://lcsc.com/product-detail/Multilayer-Ceramic-Capacitors-MLCC---SMD-SMT_Murata-Electronics-Murata-Electronics-GRM2165C1H272GA01D_C692639.html
footprint CAP-0805 (0805 (2012M) Capacitor)
pins: 1, 2

## GRM2165C1H272JA01D
designator C?  Capacitance: 2.7nF  (hidden comment: *)
Capacitor, Ceramic (MLCC), 2.7nF, ±5%, 50V, C0G, ±5%, SMD 0805; Manufacturer: Murata Electronics; Manufacturer Part Number: GRM2165C1H272JA01D; Package Size: 0805; JLCPCB Basic Part: No; JLCPCB Part Number: C97900; Supplier 1: LCSC; Category: Capacitors - MLCC; Supplier Part Number 1: C97900; Tolerance: ±5%; Voltage Rating: 50V; Temperature Coefficient: C0G; RoHS: Yes; ComponentLink1Description: Datasheet; ComponentLink1URL: https://wmsc.lcsc.com/wmsc/upload/file/pdf/v2/lcsc/1810201220_Murata-Electronics-GRM2165C1H272JA01D_C97900.pdf; ComponentLink2Description: JLCPCB Part URL; ComponentLink2URL: https://jlcpcb.com/partdetail/C97900; ComponentLink3Description: LCSC Part URL; ComponentLink3URL: https://lcsc.com/product-detail/Multilayer-Ceramic-Capacitors-MLCC---SMD-SMT_Murata-Electronics-Murata-Electronics-GRM2165C1H272JA01D_C97900.html
footprint CAP-0805 (0805 (2012M) Capacitor)
pins: 1, 2

## GRM2165C1H301JA01D
designator C?  Capacitance: 300pF  (hidden comment: *)
Capacitor, Ceramic (MLCC), 300pF, ±5%, 50V, C0G, ±5%, SMD 0805; Manufacturer: Murata Electronics; Manufacturer Part Number: GRM2165C1H301JA01D; Package Size: 0805; JLCPCB Basic Part: No; JLCPCB Part Number: C437542; Supplier 1: LCSC; Category: Capacitors - MLCC; Supplier Part Number 1: C437542; Tolerance: ±5%; Voltage Rating: 50V; Temperature Coefficient: C0G; RoHS: Yes; ComponentLink1Description: Datasheet; ComponentLink1URL: https://wmsc.lcsc.com/wmsc/upload/file/pdf/v2/lcsc/2304140030_Murata-Electronics-GRM2165C1H301JA01D_C437542.pdf; ComponentLink2Description: JLCPCB Part URL; ComponentLink2URL: https://jlcpcb.com/partdetail/C437542; ComponentLink3Description: LCSC Part URL; ComponentLink3URL: https://lcsc.com/product-detail/Multilayer-Ceramic-Capacitors-MLCC---SMD-SMT_Murata-Electronics-Murata-Electronics-GRM2165C1H301JA01D_C437542.html
footprint CAP-0805 (0805 (2012M) Capacitor)
pins: 1, 2

## GRM2165C1H302JA01D
designator C?  Capacitance: 3nF  (hidden comment: *)
Capacitor, Ceramic (MLCC), 3nF, ±5%, null, null, ±5%, SMD 0805; Manufacturer: Murata Electronics; Manufacturer Part Number: GRM2165C1H302JA01D; Package Size: 0805; JLCPCB Basic Part: No; JLCPCB Part Number: C710934; Supplier 1: LCSC; Category: Capacitors - MLCC; Supplier Part Number 1: C710934; Tolerance: ±5%; Voltage Rating: null; Temperature Coefficient: null; RoHS: Yes; ComponentLink1Description: Datasheet; ComponentLink1URL: https://wmsc.lcsc.com/wmsc/upload/file/pdf/v2/lcsc/2009181536_Murata-Electronics-GRM2165C1H302JA01D_C710934.pdf; ComponentLink2Description: JLCPCB Part URL; ComponentLink2URL: https://jlcpcb.com/partdetail/C710934; ComponentLink3Description: LCSC Part URL; ComponentLink3URL: https://lcsc.com/product-detail/Multilayer-Ceramic-Capacitors-MLCC---SMD-SMT_Murata-Electronics-Murata-Electronics-GRM2165C1H302JA01D_C710934.html
footprint CAP-0805 (0805 (2012M) Capacitor)
pins: 1, 2

## GRM2165C1H332JA01D
designator C?  Capacitance: 3.3nF  (hidden comment: *)
Capacitor, Ceramic (MLCC), 3.3nF, ±5%, 50V, C0G, ±5%, SMD 0805; Manufacturer: Murata Electronics; Manufacturer Part Number: GRM2165C1H332JA01D; Package Size: 0805; JLCPCB Basic Part: No; JLCPCB Part Number: C77062; Supplier 1: LCSC; Category: Capacitors - MLCC; Supplier Part Number 1: C77062; Tolerance: ±5%; Voltage Rating: 50V; Temperature Coefficient: C0G; RoHS: Yes; ComponentLink1Description: Datasheet; ComponentLink1URL: https://wmsc.lcsc.com/wmsc/upload/file/pdf/v2/lcsc/2304140030_Murata-Electronics-GRM2165C1H332JA01D_C77062.pdf; ComponentLink2Description: JLCPCB Part URL; ComponentLink2URL: https://jlcpcb.com/partdetail/C77062; ComponentLink3Description: LCSC Part URL; ComponentLink3URL: https://lcsc.com/product-detail/Multilayer-Ceramic-Capacitors-MLCC---SMD-SMT_Murata-Electronics-Murata-Electronics-GRM2165C1H332JA01D_C77062.html
footprint CAP-0805 (0805 (2012M) Capacitor)
pins: 1, 2

## GRM2165C1H392JA01D
designator C?  Capacitance: 3.9nF  (hidden comment: *)
Capacitor, Ceramic (MLCC), 3.9nF, ±5%, 50V, C0G, ±5%, SMD 0805; Manufacturer: Murata Electronics; Manufacturer Part Number: GRM2165C1H392JA01D; Package Size: 0805; JLCPCB Basic Part: No; JLCPCB Part Number: C97901; Supplier 1: LCSC; Category: Capacitors - MLCC; Supplier Part Number 1: C97901; Tolerance: ±5%; Voltage Rating: 50V; Temperature Coefficient: C0G; RoHS: Yes; ComponentLink1Description: Datasheet; ComponentLink1URL: https://wmsc.lcsc.com/wmsc/upload/file/pdf/v2/lcsc/1810201220_Murata-Electronics-GRM2165C1H392JA01D_C97901.pdf; ComponentLink2Description: JLCPCB Part URL; ComponentLink2URL: https://jlcpcb.com/partdetail/C97901; ComponentLink3Description: LCSC Part URL; ComponentLink3URL: https://lcsc.com/product-detail/Multilayer-Ceramic-Capacitors-MLCC---SMD-SMT_Murata-Electronics-Murata-Electronics-GRM2165C1H392JA01D_C97901.html
footprint CAP-0805 (0805 (2012M) Capacitor)
pins: 1, 2